# Altium footprint library CustomCase.PcbLib: 268 footprints (part 5 of 17)
Each footprint in its own frame and in the unit in brackets; x right, y up, seen from the top. Pads: shape width x height; smd on the part's side, far side on the other; paste and mask are expansions set on the pad; w line width, h text height; cw(c..) or ccw(c..) is an arc to the next point about the centre after c.
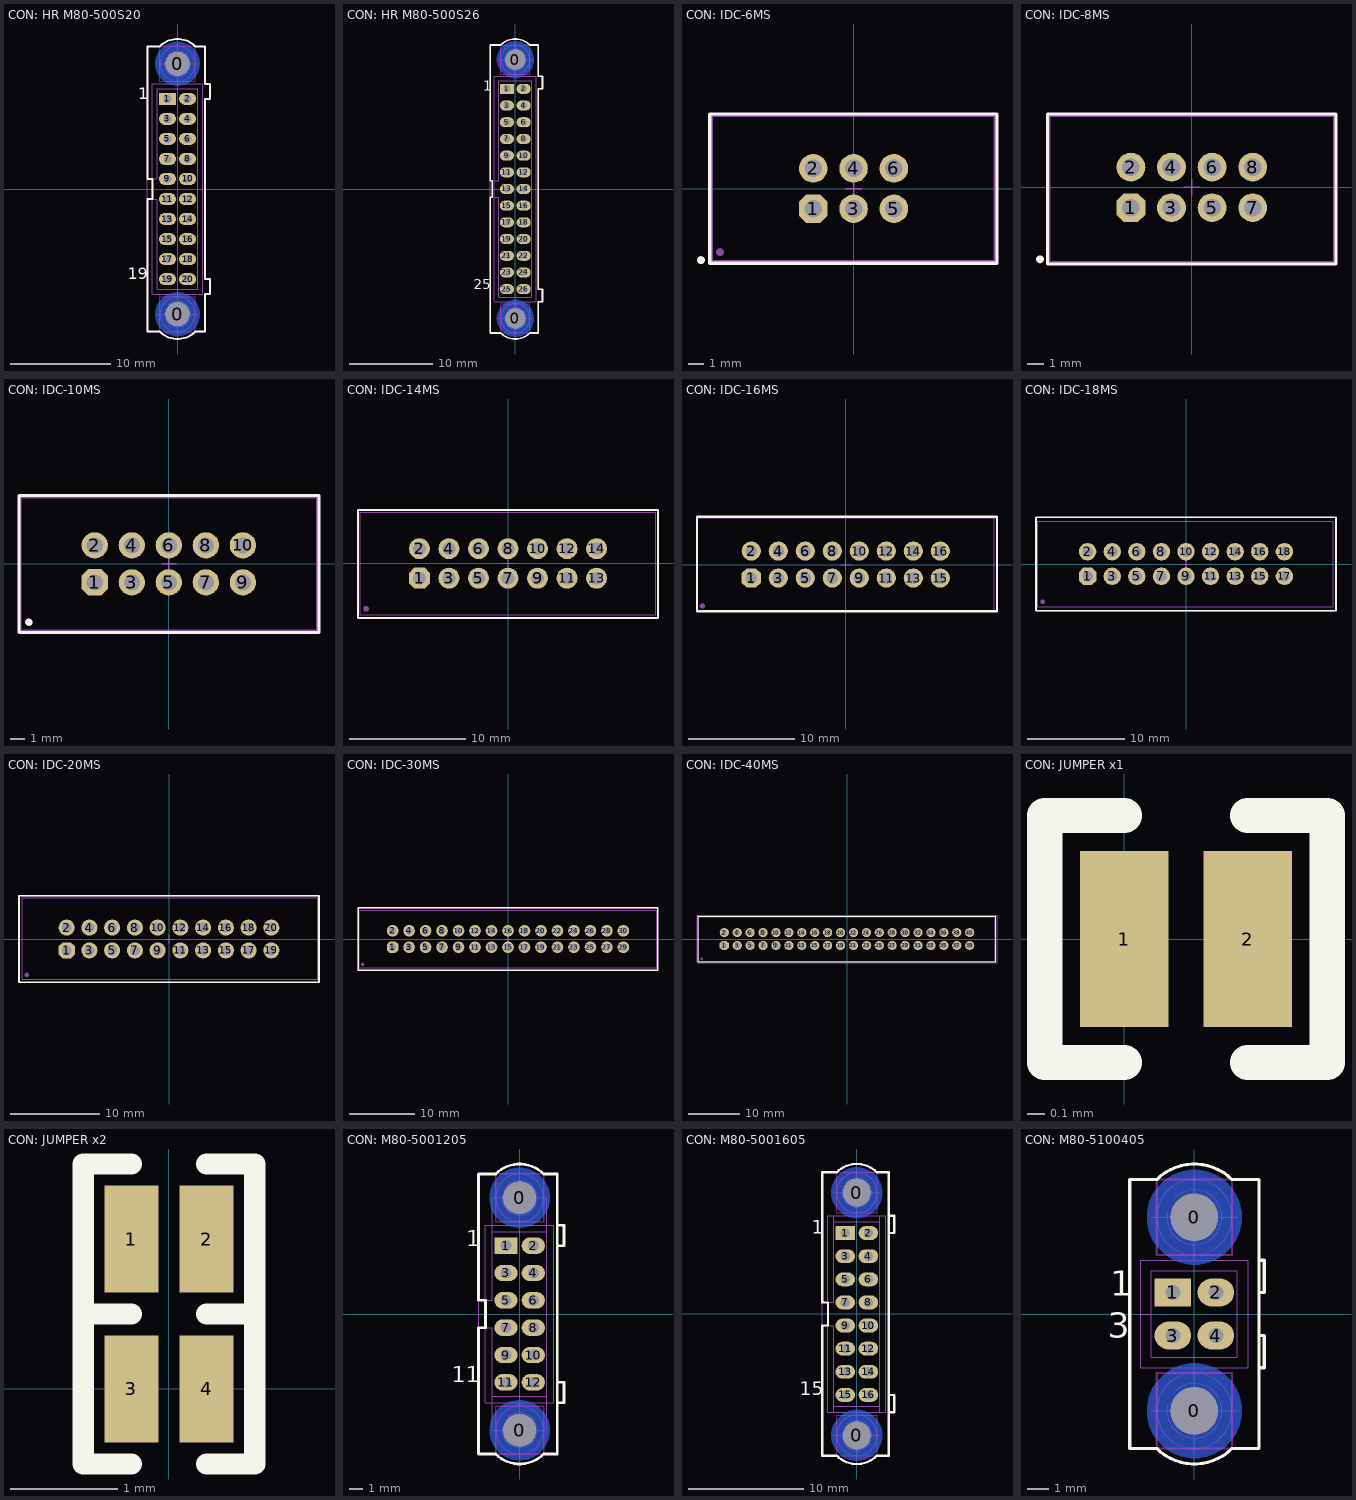
[diagram p4: the footprints below, top view; thin cyan lines are the x and y axes]

## CON: HR M80-500S20 [mm] "HR500; 20pin"
height 5.6
pads (22):
  round 2.4 hole 2.4 unplated mask+0.1: 0(0,-12.5) 0(0,12.5)
  rect 1.7x1.2 hole 0.8: 1(-1,9)
  oval 1.7x1.2 hole 0.8: 2(1,9) 3(-1,7) 4(1,7) 5(-1,5) 6(1,5) 7(-1,3) 8(1,3) 9(-1,1) 10(1,1) 11(-1,-1) 12(1,-1) 13(-1,-3) 14(1,-3) 15(-1,-5) 16(1,-5) 17(-1,-7) 18(1,-7) 19(-1,-9) 20(1,-9)
Top Layer keep-out:
  lines w0.1: -1.75,-14.25 -1.75,-10.75 1.75,-10.75 1.75,-14.25 -1.75,-14.25 ; -1.75,10.75 -1.75,14.25 1.75,14.25 1.75,10.75 -1.75,10.75
Bottom Layer:
  pour cut-out: 2.2,12.5 2.2,12.717 2.115,13.142 1.95,13.542 1.709,13.902 1.402,14.209 1.042,14.45 0.642,14.615 0.217,14.7 -0.217,14.7 -0.642,14.615 -1.042,14.45 -1.402,14.209 -1.709,13.902 -1.95,13.542 -2.115,13.142 -2.2,12.717 -2.2,12.5 -2.2,12.283 -2.115,11.858 -1.95,11.458 -1.709,11.098 -1.402,10.791 -1.042,10.55 -0.642,10.385 -0.217,10.3 0.217,10.3 0.642,10.385 1.042,10.55 1.402,10.791 1.709,11.098 1.95,11.458 2.115,11.858 2.2,12.283
  pour cut-out: 2.2,-12.5 2.2,-12.283 2.115,-11.858 1.95,-11.458 1.709,-11.098 1.402,-10.791 1.042,-10.55 0.642,-10.385 0.217,-10.3 -0.217,-10.3 -0.642,-10.385 -1.042,-10.55 -1.402,-10.791 -1.709,-11.098 -1.95,-11.458 -2.115,-11.858 -2.2,-12.283 -2.2,-12.5 -2.2,-12.717 -2.115,-13.142 -1.95,-13.542 -1.709,-13.902 -1.402,-14.209 -1.042,-14.45 -0.642,-14.615 -0.217,-14.7 0.217,-14.7 0.642,-14.615 1.042,-14.45 1.402,-14.209 1.709,-13.902 1.95,-13.542 2.115,-13.142 2.2,-12.717
Top Overlay:
  lines w0.2: -3,-14.25 -1.75,-14.25 ccw(c0,-12.5) 1.75,-14.25 2.75,-14.25 2.75,-10.5 3.25,-10.5 3.25,-9 2.75,-9 2.75,9 3.25,9 3.25,10.5 2.75,10.5 2.75,14.25 1.75,14.25 ccw(c0,12.5) -1.75,14.25 -3,14.25 -3,1 -2.5,1 -2.5,-1 -3,-1 -3,-14.25
  text "19" at -4.95,-9.4 h2
  text "1" at -3.9,8.55 h2
Top Assy:
  circle w0.05: c-1,9 r0.25
  circle w0.05: c1,9 r0.25
  circle w0.05: c1,7 r0.25
  circle w0.05: c1,5 r0.25
  circle w0.05: c1,3 r0.25
  circle w0.05: c1,1 r0.25
  circle w0.05: c1,-1 r0.25
  circle w0.05: c1,-3 r0.25
  circle w0.05: c1,-5 r0.25
  circle w0.05: c-1,-5 r0.25
  circle w0.05: c-1,-3 r0.25
  circle w0.05: c-1,-1 r0.25
  circle w0.05: c-1,1 r0.25
  circle w0.05: c-1,3 r0.25
  circle w0.05: c-1,5 r0.25
  circle w0.05: c-1,7 r0.25
  circle w0.05: c-1,-7 r0.25
  circle w0.05: c1,-7 r0.25
  circle w0.05: c-1,-9 r0.25
  circle w0.05: c1,-9 r0.25
  circle w0.05: c0,-12.5 r1
  circle w0.05: c0,12.5 r1
  circle w0.05: c0,-12.5 r1.75
  circle w0.05: c0,12.5 r1.75
  lines w0.05: -2.5,-1 -2,-1 -2,-10 2,-10 2,10 -2,10 -2,1 -2.5,1 ; -2,-12.5 2,-12.5 ; -2,12.5 2,12.5 ; -1.5,-12.5 1.5,-12.5 ; -1.25,-12.248 ccw(c0,-12.5) -0.901,-11.599 ; -1.25,12.752 ccw(c0,12.5) -0.901,13.401 ; 0,-14.5 0,-10.65 ; 0,10.6 0,14.5 ; -3,-14.25 -1.75,-14.25 ccw(c0,-12.5) 1.75,-14.25 2.75,-14.25 2.75,-10.5 3.25,-10.5 3.25,-9 2.75,-9 2.75,9 3.25,9 3.25,10.5 2.75,10.5 2.75,14.25 1.75,14.25 ccw(c0,12.5) -1.75,14.25 -3,14.25 -3,-14.25 ; -2.5,-10.5 -2.5,10.5 2.5,10.5 2.5,-10.5 -2.5,-10.5
3D body "Вилка М80-5002042_Harwin.stp": height 5.6, standoff -3.25, extent -2.775,-15 3.275,15

## CON: HR M80-500S26 [mm] "HR500; 26pin"
height 5.6
pads (28):
  round 2.4 hole 2.4 unplated mask+0.1: 0(0,-15.5) 0(0,15.5)
  rect 1.7x1.2 hole 0.8: 1(-1,12)
  oval 1.7x1.2 hole 0.8: 2(1,12) 3(-1,10) 4(1,10) 5(-1,8) 6(1,8) 7(-1,6) 8(1,6) 9(-1,4) 10(1,4) 11(-1,2) 12(1,2) 13(-1,0) 14(1,0) 15(-1,-2) 16(1,-2) 17(-1,-4) 18(1,-4) 19(-1,-6) 20(1,-6) 21(-1,-8) 22(1,-8) 23(-1,-10) 24(1,-10) 25(-1,-12) 26(1,-12)
Top Layer keep-out:
  lines w0.1: -1.75,-17.25 1.75,-17.25 1.75,-13.75 -1.75,-13.75 -1.75,-17.25 ; -1.75,13.75 1.75,13.75 1.75,17.25 -1.75,17.25 -1.75,13.75
Bottom Layer:
  pour cut-out: 2.2,-15.5 2.2,-15.283 2.115,-14.858 1.95,-14.458 1.709,-14.098 1.402,-13.791 1.042,-13.55 0.642,-13.385 0.217,-13.3 -0.217,-13.3 -0.642,-13.385 -1.042,-13.55 -1.402,-13.791 -1.709,-14.098 -1.95,-14.458 -2.115,-14.858 -2.2,-15.283 -2.2,-15.5 -2.2,-15.717 -2.115,-16.142 -1.95,-16.542 -1.709,-16.902 -1.402,-17.209 -1.042,-17.45 -0.642,-17.615 -0.217,-17.7 0.217,-17.7 0.642,-17.615 1.042,-17.45 1.402,-17.209 1.709,-16.902 1.95,-16.542 2.115,-16.142 2.2,-15.717
  pour cut-out: 2.2,15.5 2.2,15.717 2.115,16.142 1.95,16.542 1.709,16.902 1.402,17.209 1.042,17.45 0.642,17.615 0.217,17.7 -0.217,17.7 -0.642,17.615 -1.042,17.45 -1.402,17.209 -1.709,16.902 -1.95,16.542 -2.115,16.142 -2.2,15.717 -2.2,15.5 -2.2,15.283 -2.115,14.858 -1.95,14.458 -1.709,14.098 -1.402,13.791 -1.042,13.55 -0.642,13.385 -0.217,13.3 0.217,13.3 0.642,13.385 1.042,13.55 1.402,13.791 1.709,14.098 1.95,14.458 2.115,14.858 2.2,15.283
Top Overlay:
  lines w0.2: -1.75,17.25 cw(c0,15.5) 1.75,17.25 2.75,17.25 ; -1.75,17.25 -3,17.25 -3,1 -2.75,1 -2.75,-1 -3,-1 -3,-17.25 -1.75,-17.25 ccw(c0,-15.5) 1.75,-17.25 2.75,-17.25 2.75,-13.5 3.25,-13.5 3.25,-12 2.75,-12 2.75,12 3.25,12 3.25,13.5 2.75,13.5 2.75,17.25 ; -1.75,17.25 -1.75,17.25 ; 2.75,17.25 2.75,17.25
  text "1" at -3.85,11.375 h2
  text "25" at -5,-12.425 h2
Top Assy:
  circle w0.05: c-1,12 r0.25
  circle w0.05: c1,12 r0.25
  circle w0.05: c1,10 r0.25
  circle w0.05: c1,8 r0.25
  circle w0.05: c1,6 r0.25
  circle w0.05: c1,4 r0.25
  circle w0.05: c1,2 r0.25
  circle w0.05: c1,0 r0.25
  circle w0.05: c1,-2 r0.25
  circle w0.05: c-1,-2 r0.25
  circle w0.05: c-1,0 r0.25
  circle w0.05: c-1,2 r0.25
  circle w0.05: c-1,4 r0.25
  circle w0.05: c-1,6 r0.25
  circle w0.05: c-1,8 r0.25
  circle w0.05: c-1,10 r0.25
  circle w0.05: c-1,-4 r0.25
  circle w0.05: c1,-4 r0.25
  circle w0.05: c-1,-12 r0.25
  circle w0.05: c-1,-10 r0.25
  circle w0.05: c-1,-8 r0.25
  circle w0.05: c-1,-6 r0.25
  circle w0.05: c1,-12 r0.25
  circle w0.05: c1,-10 r0.25
  circle w0.05: c1,-8 r0.25
  circle w0.05: c1,-6 r0.25
  circle w0.05: c0,-15.5 r1
  circle w0.05: c0,15.5 r1
  circle w0.05: c0,-15.5 r1.75
  circle w0.05: c0,15.5 r1.75
  lines w0.05: -2.5,-1 -2,-1 -2,-13 2,-13 2,13 -2,13 -2,1 -2.5,1 ; -2,-15.5 2,-15.5 ; -2,15.5 2,15.5 ; -1.5,-15.5 1.5,-15.5 ; -1.25,-15.248 ccw(c0,-15.5) -0.901,-14.599 ; -1.25,15.752 ccw(c0,15.5) -0.901,16.401 ; 0,-17.5 0,-13.65 ; 0,13.6 0,17.5 ; -3,-17.25 -1.75,-17.25 ccw(c0,-15.5) 1.75,-17.25 2.75,-17.25 2.75,-13.5 3.25,-13.5 3.25,-12 2.75,-12 2.75,12 3.25,12 3.25,13.5 2.75,13.5 2.75,17.25 1.75,17.25 ccw(c0,15.5) -1.75,17.25 -3,17.25 -3,-17.25 ; -2.5,-13.5 -2.5,13.5 2.5,13.5 2.5,-13.5 -2.5,-13.5
3D body "m80-5002642_asm.stp": height 5.6, standoff -3.25, extent -3.025,-18 3.025,18

## CON: IDC-6MS [mm] "IDC-6MS 6 pin PCB-mount connector"
height 10
pads (8):
  oct 1.8x1.8 hole 1.1: 1(-2.54,-1.27)
  round 1.8 hole 1.1: 2(-2.54,1.27) 3(0,-1.27) 4(0,1.27) 5(2.54,-1.27) 6(2.54,1.27)
  round 0.5 on Top Overlay: ""(-9.6,-4.5)
  round 0.5 on Mech1: ""(-8.4,-4)
Top Overlay:
  lines w0.2: -9.05,-4.7 -9.05,4.7 9.025,4.7 9.025,-4.7 -9.05,-4.7
Top Assy:
  lines w0.1: -8.89,-4.55 8.87,-4.55 8.87,4.55 -8.89,4.55 -8.89,-4.55
Size Area:
  lines w0.1: -0.5,0 0.5,0 ; 0,-0.5 0,0.5 ; -8.975,-4.65 -8.975,4.65 8.975,4.65 8.975,-4.65 -8.975,-4.65
3D body "IDC-6MS.STEP": height 9, standoff -3, extent -8.89,-4.55 8.87,4.55

## CON: IDC-8MS [mm]
height 10
pads (9):
  oct 1.8x1.8 hole 1.1: 1(-3.81,-1.27)
  round 1.8 hole 1.1: 2(-3.81,1.27) 3(-1.27,-1.27) 4(-1.27,1.27) 5(1.27,-1.27) 6(1.27,1.27) 7(3.81,-1.27) 8(3.81,1.27)
  round 0.5 on Top Overlay: ""(-9.5,-4.5)
Top Overlay:
  lines w0.2: -9.025,-4.8 9.025,-4.8 9.025,4.6 -9.025,4.6 -9.025,-4.8
Top Assy:
  lines w0.1: -8.89,-4.65 8.89,-4.65 8.89,4.45 -8.89,4.45 -8.89,-4.65
Size Area:
  lines w0.1: -0.5,0 0.5,0 ; 0,-0.5 0,0.5 ; -8.975,-4.75 8.975,-4.75 8.975,4.55 -8.975,4.55 -8.975,-4.75
3D body "6666.STEP": height 8.9, standoff -3.2, extent -8.89,-4.65 8.89,4.45

## CON: IDC-10MS [mm] "IDC-10MS 10 pin PCB-mount header"
height 10
pads (12):
  oct 1.8x1.8 hole 1.1: 1(-5.08,-1.27)
  round 1.8 hole 1.1: 2(-5.08,1.27) 3(-2.54,-1.27) 4(-2.54,1.27) 5(0,-1.27) 6(0,1.27) 7(2.54,-1.27) 8(2.54,1.27) 9(5.08,-1.27) 10(5.08,1.27)
  round 0.5 on Mech1: ""(-9.6,-4)
  round 0.5 on Top Overlay: ""(-9.6,-4)
Top Overlay:
  lines w0.2: -10.275,-4.7 10.3,-4.7 10.3,4.675 -10.275,4.675 -10.275,-4.7
Top Assy:
  lines w0.1: -10.14,-4.572 -10.14,4.528 10.16,4.528 10.16,-4.572 -10.14,-4.572
Size Area:
  lines w0.1: -0.5,0 0.5,0 ; 0,-0.5 0,0.5 ; -10.225,-4.65 10.25,-4.65 10.25,4.625 -10.225,4.625 -10.225,-4.65
3D body "IDC-10MS.STEP": height 9, standoff -3.1, extent -10.14,-4.572 10.16,4.528

## CON: IDC-14MS [mm] "IDC-14MS connector"
height 9
pads (15):
  oct 1.8x1.8 hole 1.1: 1(-7.62,-1.27)
  round 1.8 hole 1.1: 2(-7.62,1.27) 3(-5.08,-1.27) 4(-5.08,1.27) 5(-2.54,-1.27) 6(-2.54,1.27) 7(0,-1.27) 8(0,1.27) 9(2.54,-1.27) 10(2.54,1.27) 11(5.08,-1.27) 12(5.08,1.27) 13(7.62,-1.27) 14(7.62,1.27)
  round 0.5 on Mech1: 38(-12.2,-3.9)
Top Overlay:
  lines w0.2: -12.9,-4.7 12.9,-4.7 12.9,4.6 -12.9,4.6 -12.9,-4.7
Top Assy:
  lines w0.1: -12.7,-4.4 -12.7,4.4 12.7,4.4 12.7,-4.4 -12.7,-4.4
Size Area:
  lines w0.1: -0.5,0 0.5,0 ; 0,-0.5 0,0.5 ; -12.9,-4.7 12.9,-4.7 12.9,4.6 -12.9,4.6 -12.9,-4.7
3D body "IDC-14MS.STEP": height 9.1, standoff -3, extent -12.715,-4.4 12.715,4.4

## CON: IDC-16MS [mm] "IDC-16MS straight leads pcb mount"
height 9
pads (17):
  oct 1.8x1.8 hole 1.1: 1(-8.89,-1.27)
  round 1.8 hole 1.1: 2(-8.89,1.27) 3(-6.35,-1.27) 4(-6.35,1.27) 5(-3.81,-1.27) 6(-3.81,1.27) 7(-1.27,-1.27) 8(-1.27,1.27) 9(1.27,-1.27) 10(1.27,1.27) 11(3.81,-1.27) 12(3.81,1.27) 13(6.35,-1.27) 14(6.35,1.27) 15(8.89,-1.27) 16(8.89,1.27)
  round 0.5 on Mech1: 39(-13.5,-3.9)
Top Overlay:
  lines w0.2: -14,-4.4 -14,4.5 14.224,4.5 14.224,-4.4 -14,-4.4
Top Assy:
  lines w0.1: -13.985,-4.4 13.985,-4.4 13.985,4.4 -13.985,4.4 -13.985,4.285 -13.985,-4.4
Size Area:
  lines w0.1: -0.5,0 0.5,0 ; 0,-0.5 0,0.5 ; -14,-4.4 -14,4.5 14.224,4.5 14.224,-4.4 -14,-4.4
3D body "IDC-16MS.STEP": height 9.1, standoff -3, extent -13.985,-4.4 13.985,4.4

## CON: IDC-18MS [mm]
height 10
pads (19):
  oct 1.8x1.8 hole 1.1: 1(-10.16,-1.27)
  round 1.8 hole 1.1: 2(-10.16,1.27) 3(-7.62,-1.27) 4(-7.62,1.27) 5(-5.08,-1.27) 6(-5.08,1.27) 7(-2.54,-1.27) 8(-2.54,1.27) 9(0,-1.27) 10(0,1.27) 11(2.54,-1.27) 12(2.54,1.27) 13(5.08,-1.27) 14(5.08,1.27) 15(7.62,-1.27) 16(7.62,1.27) 17(10.16,-1.27) 18(10.16,1.27)
  round 0.5 on Mech1: 40(-14.8,-3.9)
Top Overlay:
  lines w0.2: -15.494,-4.826 15.494,-4.826 15.494,4.826 -15.494,4.826 -15.494,-4.826
Top Assy:
  lines w0.1: -15.3,-4.4 -15.3,4.4 15.2,4.4 15.2,-4.4 -15.3,-4.4
Size Area:
  lines w0.1: -0.5,0 0.5,0 ; 0,-0.5 0,0.5 ; -15.494,-4.826 15.494,-4.826 15.494,4.826 -15.494,4.826 -15.494,-4.826
3D body "IDC-18MS.STEP": height 10.54, standoff -1, extent -15.28,-4.378 15.23,4.422

## CON: IDC-20MS [mm]
height 10
pads (21):
  oct 1.8x1.8 hole 1.1: 1(-11.43,-1.27)
  round 1.8 hole 1.1: 2(-11.43,1.27) 3(-8.89,-1.27) 4(-8.89,1.27) 5(-6.35,-1.27) 6(-6.35,1.27) 7(-3.81,-1.27) 8(-3.81,1.27) 9(-1.27,-1.27) 10(-1.27,1.27) 11(1.27,-1.27) 12(1.27,1.27) 13(3.81,-1.27) 14(3.81,1.27) 15(6.35,-1.27) 16(6.35,1.27) 17(8.89,-1.27) 18(8.89,1.27) 19(11.43,-1.27) 20(11.43,1.27)
  round 0.5 on Mech1: 41(-15.9,-4)
Top Overlay:
  lines w0.2: -16.764,-4.826 -16.764,4.826 16.764,4.826 16.764,-4.826 -16.764,-4.826
Top Assy:
  lines w0.1: -16.4,-4.5 16.6,-4.5 16.6,4.6 -16.4,4.6 -16.4,-4.5
Size Area:
  lines w0.1: -0.5,0 0.5,0 ; 0,-0.5 0,0.5 ; -16.764,-4.826 -16.764,4.826 16.764,4.826 16.764,-4.826 -16.764,-4.826
3D body "IDC-20MS.STEP": height 9, standoff -3, extent -16.43,-4.52 16.57,4.58

## CON: IDC-30MS [mm]
height 10
pads (31):
  oct 1.8x1.8 hole 1.1: 1(-17.78,-1.27)
  round 1.8 hole 1.1: 2(-17.78,1.27) 3(-15.24,-1.27) 4(-15.24,1.27) 5(-12.7,-1.27) 6(-12.7,1.27) 7(-10.16,-1.27) 8(-10.16,1.27) 9(-7.62,-1.27) 10(-7.62,1.27) 11(-5.08,-1.27) 12(-5.08,1.27) 13(-2.54,-1.27) 14(-2.54,1.27) 15(0,-1.27) 16(0,1.27) 17(2.54,-1.27) 18(2.54,1.27) 19(5.08,-1.27) 20(5.08,1.27) 21(7.62,-1.27) 22(7.62,1.27) 23(10.16,-1.27) 24(10.16,1.27) 25(12.7,-1.27) 26(12.7,1.27) 27(15.24,-1.27) 28(15.24,1.27) 29(17.78,-1.27) 30(17.78,1.27)
  round 0.5 on Mech1: 42(-22.4,-3.9)
Top Overlay:
  lines w0.2: -23.114,-4.826 -23.114,4.826 23.114,4.826 23.114,-4.826 -23.114,-4.826
Top Assy:
  lines w0.1: -22.9,-4.4 22.9,-4.4 22.9,4.4 -22.9,4.4 -22.9,-4.4
Size Area:
  lines w0.1: -0.5,0 0.5,0 ; 0,-0.5 0,0.5 ; -23.114,-4.826 -23.114,4.826 23.114,4.826 23.114,-4.826 -23.114,-4.826
3D body "IDC-30MS.STEP": height 8.78, standoff -3, extent -22.881,-4.392 22.869,4.408

## CON: IDC-40MS [mm]
height 10
pads (41):
  oct 1.8x1.8 hole 1.1: 1(-24.13,-1.27)
  round 1.8 hole 1.1: 2(-24.13,1.27) 3(-21.59,-1.27) 4(-21.59,1.27) 5(-19.05,-1.27) 6(-19.05,1.27) 7(-16.51,-1.27) 8(-16.51,1.27) 9(-13.97,-1.27) 10(-13.97,1.27) 11(-11.43,-1.27) 12(-11.43,1.27) 13(-8.89,-1.27) 14(-8.89,1.27) 15(-6.35,-1.27) 16(-6.35,1.27) 17(-3.81,-1.27) 18(-3.81,1.27) 19(-1.27,-1.27) 20(-1.27,1.27) 21(1.27,-1.27) 22(1.27,1.27) 23(3.87,-1.27) 24(3.81,1.27) 25(6.35,-1.27) 26(6.35,1.27) 27(8.89,-1.27) 28(8.89,1.27) 29(11.43,-1.27) 30(11.43,1.27) 31(13.97,-1.27) 32(13.97,1.27) 33(16.51,-1.27) 34(16.51,1.27) 35(19.05,-1.27) 36(19.05,1.27) 37(21.59,-1.27) 38(21.59,1.27) 39(24.13,-1.27) 40(24.13,1.27)
  round 0.5 on Mech1: 43(-28.6,-3.9)
Top Overlay:
  lines w0.2: -29.3,-4.5 29.3,-4.5 29.3,4.5 -29.3,4.5 -29.3,-4.5
Top Assy:
  lines w0.1: -29.2,-4.4 -29.2,4.4 29.2,4.4 29.2,-4.4 -29.2,-4.4
Size Area:
  lines w0.1: -0.5,0 0.5,0 ; 0,-0.5 0,0.5 ; -29.5,-4.7 29.5,-4.7 29.5,4.7 -29.5,4.7 -29.5,-4.7
3D body "IDC-40MS.STEP": height 8.78, standoff -3, extent -29.225,-4.4 29.225,4.4

## CON: JUMPER x1 [mm]
pads (2):
  rect 0.5x1 smd: 1(0,0) 2(0.7,0)
Top Overlay:
  lines w0.2: 0,-0.7 -0.45,-0.7 -0.45,0.7 0,0.7 ; 0.7,-0.7 1.15,-0.7 1.15,0.7 0.7,0.7

## CON: JUMPER x2 [mm]
pads (4):
  rect 0.5x1 smd: 1(-0.35,1.4) 2(0.35,1.4) 3(-0.35,0) 4(0.35,0)
Top Overlay:
  lines w0.2: -0.35,-0.7 -0.8,-0.7 -0.8,0.7 ; -0.35,2.1 -0.8,2.1 -0.8,0.7 ; 0.35,-0.7 0.8,-0.7 0.8,0.7 ; 0.35,2.1 0.8,2.1 0.8,0.7 ; -0.8,0.7 -0.35,0.7 -0.8,0.7 ; 0.8,0.7 0.35,0.7 0.8,0.7

## CON: M80-5001205 [mm] "12pin Harwin"
height 5.6
pads (14):
  round 2.4 hole 2.4 unplated mask+0.1: 0(0,-8.5) 0(0,8.5)
  rect 1.7x1.2 hole 0.8: 1(-1,5)
  oval 1.7x1.2 hole 0.8: 2(1,5) 3(-1,3) 4(1,3) 5(-1,1) 6(1,1) 7(-1,-1) 8(1,-1) 9(-1,-3) 10(1,-3) 11(-1,-5) 12(1,-5)
Top Layer keep-out:
  lines w0.1: -1.75,-10.25 -1.75,-6.75 1.75,-6.75 1.75,-10.25 -1.75,-10.25 ; -1.75,6.75 -1.75,10.25 1.75,10.25 1.75,6.75 -1.75,6.75
Bottom Layer:
  pour cut-out: 2.2,8.5 2.2,8.717 2.115,9.142 1.95,9.542 1.709,9.902 1.402,10.209 1.042,10.45 0.642,10.615 0.217,10.7 -0.217,10.7 -0.642,10.615 -1.042,10.45 -1.402,10.209 -1.709,9.902 -1.95,9.542 -2.115,9.142 -2.2,8.717 -2.2,8.5 -2.2,8.283 -2.115,7.858 -1.95,7.458 -1.709,7.098 -1.402,6.791 -1.042,6.55 -0.642,6.385 -0.217,6.3 0.217,6.3 0.642,6.385 1.042,6.55 1.402,6.791 1.709,7.098 1.95,7.458 2.115,7.858 2.2,8.283
  pour cut-out: 2.2,-8.5 2.2,-8.283 2.115,-7.858 1.95,-7.458 1.709,-7.098 1.402,-6.791 1.042,-6.55 0.642,-6.385 0.217,-6.3 -0.217,-6.3 -0.642,-6.385 -1.042,-6.55 -1.402,-6.791 -1.709,-7.098 -1.95,-7.458 -2.115,-7.858 -2.2,-8.283 -2.2,-8.5 -2.2,-8.717 -2.115,-9.142 -1.95,-9.542 -1.709,-9.902 -1.402,-10.209 -1.042,-10.45 -0.642,-10.615 -0.217,-10.7 0.217,-10.7 0.642,-10.615 1.042,-10.45 1.402,-10.209 1.709,-9.902 1.95,-9.542 2.115,-9.142 2.2,-8.717
Top Overlay:
  lines w0.2: 2.75,-9 2.75,9 ; 2.75,-5 3.25,-5 3.25,-6.5 2.75,-6.5 2.75,-10.25 1.75,-10.25 cw(c0,-8.5) -1.75,-10.25 -3,-10.25 -3,-1 -2.5,-1 -2.5,1 -3,1 -3,10.25 -1.75,10.25 cw(c0,8.5) 1.75,10.25 2.75,10.25 2.75,6.5 3.25,6.5 3.25,5 2.75,5
  text "11" at -4.95,-5.4 h2
  text "1" at -3.9,4.55 h2
Top Assy:
  circle w0.05: c1,5 r0.25
  circle w0.05: c1,5 r0.25
  circle w0.05: c1,3 r0.25
  circle w0.05: c1,1 r0.25
  circle w0.05: c1,-1 r0.25
  circle w0.05: c1,-3 r0.25
  circle w0.05: c1,-5 r0.25
  circle w0.05: c-1,-3 r0.25
  circle w0.05: c-1,-1 r0.25
  circle w0.05: c-1,1 r0.25
  circle w0.05: c-1,3 r0.25
  circle w0.05: c-1,5 r0.25
  circle w0.05: c-1,5 r0.25
  circle w0.05: c-1,-5 r0.25
  circle w0.05: c1,-5 r0.25
  circle w0.05: c0,-8.5 r1
  circle w0.05: c0,8.5 r1
  circle w0.05: c0,-8.5 r1.75
  circle w0.05: c0,8.5 r1.75
  circle w0.05: c-1,-5 r0.25
  lines w0.05: -2.5,-1 -2,-1 -2,-8.5 2,-8.5 2,8.5 -2,8.5 -2,1 -2.5,1 ; -2,-6 2,-6 ; -2,6 2,6 ; -1.5,-8.5 1.5,-8.5 ; -1.25,-8.248 ccw(c0,-8.5) -0.901,-7.599 ; -1.25,8.752 ccw(c0,8.5) -0.901,9.401 ; 0,-10.5 0,-6.65 ; 0,6.6 0,10.5 ; 2.75,-9 2.75,9 ; 2.75,-5 3.25,-5 3.25,-6.5 2.75,-6.5 2.75,-10.25 1.75,-10.25 cw(c0,-8.5) -1.75,-10.25 -3,-10.25 -3,10.25 -1.75,10.25 cw(c0,8.5) 1.75,10.25 2.75,10.25 2.75,6.5 3.25,6.5 3.25,5 2.75,5 ; -2.5,-6.5 -2.5,6.5 2.5,6.5 2.5,-6.5 -2.5,-6.5
3D body "m80-5101205_asm.stp": height 5.6, standoff -4.6, extent -2.775,-11 3.275,11

## CON: M80-5001605 [mm] "16pin Harwin"
height 5.6
pads (18):
  round 2.4 hole 2.4 unplated mask+0.1: 0(0,-10.5) 0(0,10.5)
  rect 1.7x1.2 hole 0.8: 1(-1,7)
  oval 1.7x1.2 hole 0.8: 2(1,7) 3(-1,5) 4(1,5) 5(-1,3) 6(1,3) 7(-1,1) 8(1,1) 9(-1,-1) 10(1,-1) 11(-1,-3) 12(1,-3) 13(-1,-5) 14(1,-5) 15(-1,-7) 16(1,-7)
Top Layer keep-out:
  lines w0.1: -1.75,-12.25 -1.75,-8.75 1.75,-8.75 1.75,-12.25 -1.75,-12.25 ; -1.75,8.75 -1.75,12.25 1.75,12.25 1.75,8.75 -1.75,8.75
Bottom Layer:
  pour cut-out: 2.2,10.5 2.2,10.717 2.115,11.142 1.95,11.542 1.709,11.902 1.402,12.209 1.042,12.45 0.642,12.615 0.217,12.7 -0.217,12.7 -0.642,12.615 -1.042,12.45 -1.402,12.209 -1.709,11.902 -1.95,11.542 -2.115,11.142 -2.2,10.717 -2.2,10.5 -2.2,10.283 -2.115,9.858 -1.95,9.458 -1.709,9.098 -1.402,8.791 -1.042,8.55 -0.642,8.385 -0.217,8.3 0.217,8.3 0.642,8.385 1.042,8.55 1.402,8.791 1.709,9.098 1.95,9.458 2.115,9.858 2.2,10.283
  pour cut-out: 2.2,-10.5 2.2,-10.283 2.115,-9.858 1.95,-9.458 1.709,-9.098 1.402,-8.791 1.042,-8.55 0.642,-8.385 0.217,-8.3 -0.217,-8.3 -0.642,-8.385 -1.042,-8.55 -1.402,-8.791 -1.709,-9.098 -1.95,-9.458 -2.115,-9.858 -2.2,-10.283 -2.2,-10.5 -2.2,-10.717 -2.115,-11.142 -1.95,-11.542 -1.709,-11.902 -1.402,-12.209 -1.042,-12.45 -0.642,-12.615 -0.217,-12.7 0.217,-12.7 0.642,-12.615 1.042,-12.45 1.402,-12.209 1.709,-11.902 1.95,-11.542 2.115,-11.142 2.2,-10.717
Top Overlay:
  lines w0.2: 2.75,-9 2.75,9 ; 2.75,-7 3.25,-7 3.25,-8.5 2.75,-8.5 2.75,-12.25 1.75,-12.25 cw(c0,-10.5) -1.75,-12.25 -3,-12.25 -3,-1 -2.5,-1 -2.5,1 -3,1 -3,12.25 -1.75,12.25 cw(c0,10.5) 1.75,12.25 2.75,12.25 2.75,8.5 3.25,8.5 3.25,7 2.75,7
  text "15" at -4.95,-7.4 h2
  text "1" at -3.9,6.55 h2
Top Assy:
  circle w0.05: c1,7 r0.25
  circle w0.05: c1,5 r0.25
  circle w0.05: c1,3 r0.25
  circle w0.05: c1,1 r0.25
  circle w0.05: c1,-1 r0.25
  circle w0.05: c1,-3 r0.25
  circle w0.05: c1,-5 r0.25
  circle w0.05: c-1,-3 r0.25
  circle w0.05: c-1,-1 r0.25
  circle w0.05: c-1,1 r0.25
  circle w0.05: c-1,3 r0.25
  circle w0.05: c-1,5 r0.25
  circle w0.05: c-1,7 r0.25
  circle w0.05: c-1,-7 r0.25
  circle w0.05: c1,-7 r0.25
  circle w0.05: c0,-10.5 r1
  circle w0.05: c0,10.5 r1
  circle w0.05: c0,-10.5 r1.75
  circle w0.05: c0,10.5 r1.75
  circle w0.05: c-1,-5 r0.25
  lines w0.05: -2.5,-1 -2,-1 -2,-8.5 ; -2.5,1 -2,1 -2,8.5 ; -2,-10.5 2,-10.5 ; -2,-8 2,-8 ; -2,8 2,8 ; -2,10.5 2,10.5 ; -1.5,-10.5 1.5,-10.5 ; -1.25,-10.248 ccw(c0,-10.5) -0.901,-9.599 ; -1.25,10.752 ccw(c0,10.5) -0.901,11.401 ; 0,-12.5 0,-8.65 ; 0,8.6 0,12.5 ; 2,-8.5 2,8.5 ; 2.75,-9 2.75,9 ; 2.75,-7 3.25,-7 3.25,-8.5 2.75,-8.5 2.75,-12.25 1.75,-12.25 cw(c0,-10.5) -1.75,-12.25 -3,-12.25 -3,12.25 -1.75,12.25 cw(c0,10.5) 1.75,12.25 2.75,12.25 2.75,8.5 3.25,8.5 3.25,7 2.75,7 ; -2.5,-8.5 -2.5,8.5 2.5,8.5 2.5,-8.5 -2.5,-8.5
3D body "m80-5001605_asm.stp": height 5.6, standoff -3.25, extent -2.775,-13 3.275,13

## CON: M80-5100405 [mm] "4 pin; Harwin"
height 5.5
pads (6):
  round 2.2 hole 2.2 unplated: 0(0,-4.5) 0(0,4.5)
  rect 1.7x1.3 hole 0.7: 1(-1,1)
  oval 1.7x1.3 hole 0.7: 2(1,1) 3(-1,-1) 4(1,-1)
Top Layer keep-out:
  lines w0.1: -1.75,-6.25 -1.75,-2.75 1.75,-2.75 1.75,-6.25 -1.75,-6.25 ; -1.75,2.75 1.75,2.75 1.75,6.25 -1.75,6.25 -1.75,2.75
Bottom Layer:
  pour cut-out: 2.2,4.5 2.2,4.717 2.115,5.142 1.95,5.542 1.709,5.902 1.402,6.209 1.042,6.45 0.642,6.615 0.217,6.7 -0.217,6.7 -0.642,6.615 -1.042,6.45 -1.402,6.209 -1.709,5.902 -1.95,5.542 -2.115,5.142 -2.2,4.717 -2.2,4.5 -2.2,4.283 -2.115,3.858 -1.95,3.458 -1.709,3.098 -1.402,2.791 -1.042,2.55 -0.642,2.385 -0.217,2.3 0.217,2.3 0.642,2.385 1.042,2.55 1.402,2.791 1.709,3.098 1.95,3.458 2.115,3.858 2.2,4.283
  pour cut-out: 2.2,-4.5 2.2,-4.283 2.115,-3.858 1.95,-3.458 1.709,-3.098 1.402,-2.791 1.042,-2.55 0.642,-2.385 0.217,-2.3 -0.217,-2.3 -0.642,-2.385 -1.042,-2.55 -1.402,-2.791 -1.709,-3.098 -1.95,-3.458 -2.115,-3.858 -2.2,-4.283 -2.2,-4.5 -2.2,-4.717 -2.115,-5.142 -1.95,-5.542 -1.709,-5.902 -1.402,-6.209 -1.042,-6.45 -0.642,-6.615 -0.217,-6.7 0.217,-6.7 0.642,-6.615 1.042,-6.45 1.402,-6.209 1.709,-5.902 1.95,-5.542 2.115,-5.142 2.2,-4.717
Top Overlay:
  lines w0.15: 3,-5 3,3 ; 3,-1 3.25,-1 3.25,-2.5 3,-2.5 3,-6.25 1.75,-6.25 cw(c0,-4.5) -1.75,-6.25 -3,-6.25 -3,6.25 -1.75,6.25 cw(c0,4.5) 1.75,6.25 3,6.25 3,2.5 3.25,2.5 3.25,1 3,1
  text "1" at -3.9,0.45 h2
  text "3" at -4.027,-1.5 h2
Top Assy:
  circle w0.05: c-1,1 r0.25
  circle w0.05: c1,1 r0.25
  circle w0.05: c1,1 r0.25
  circle w0.05: c1,-1 r0.25
  circle w0.05: c1,-1 r0.25
  circle w0.05: c1,-1 r0.25
  circle w0.05: c-1,-1 r0.25
  circle w0.05: c-1,-1 r0.25
  circle w0.05: c-1,-1 r0.25
  circle w0.05: c-1,1 r0.25
  circle w0.05: c0,4.5 r1
  circle w0.05: c0,4.5 r1.75
  circle w0.05: c0,-4.5 r1
  circle w0.05: c0,-4.5 r1.75
  lines w0.05: -3,-3 -3,6.25 -1.75,6.25 cw(c0,4.5) 1.75,6.25 3,6.25 3,2.5 3.25,2.5 3.25,1 3,1 ; -3,-1 -3,-6.25 -1.75,-6.25 ccw(c0,-4.5) 1.75,-6.25 3,-6.25 3,-2.5 3.25,-2.5 ; -2,-4.5 2,-4.5 ; -2,4.5 2,4.5 ; -1.5,-4.5 1.5,-4.5 ; -1.25,-4.248 ccw(c0,-4.5) -0.901,-3.599 ; -1.25,4.752 ccw(c0,4.5) -0.901,5.401 ; 0,-6.5 0,-2.65 ; 0,2.6 0,6.5 ; 2,-1 2,-2 ; 2.5,-1 2.5,-2.5 ; 3,3 3,-3 3,-1 3.25,-1 ; -2.5,0 -2.5,-2.5 0,-2.5 2.5,-2.5 ; -2.5,0 -2.5,-2 -2.5,2.5 2.5,2.5 2.5,-2.5 ; -2.5,0 -2,0 ; -2.5,0 -2,0 ; -2,-2 -2,2 2,2 2,-2 ; -2,-2 -2,0 ; -2,-2 2,-2 ; -2,-2 -2,0 ; 3.25,-2.5 3.25,-1 ; 3.25,-2.5 3.25,-1
3D body "m80-5100405_asm.stp": height 5.6, standoff -4.6, extent -2.775,-7 3.275,7